# Altium footprint library SOM.PcbLib: 8 footprints
Each footprint in its own frame and in the unit in brackets; x right, y up, seen from the top. Pads: shape width x height; smd on the part's side, far side on the other; paste and mask are expansions set on the pad; w line width, h text height; cw(c..) or ccw(c..) is an arc to the next point about the centre after c.
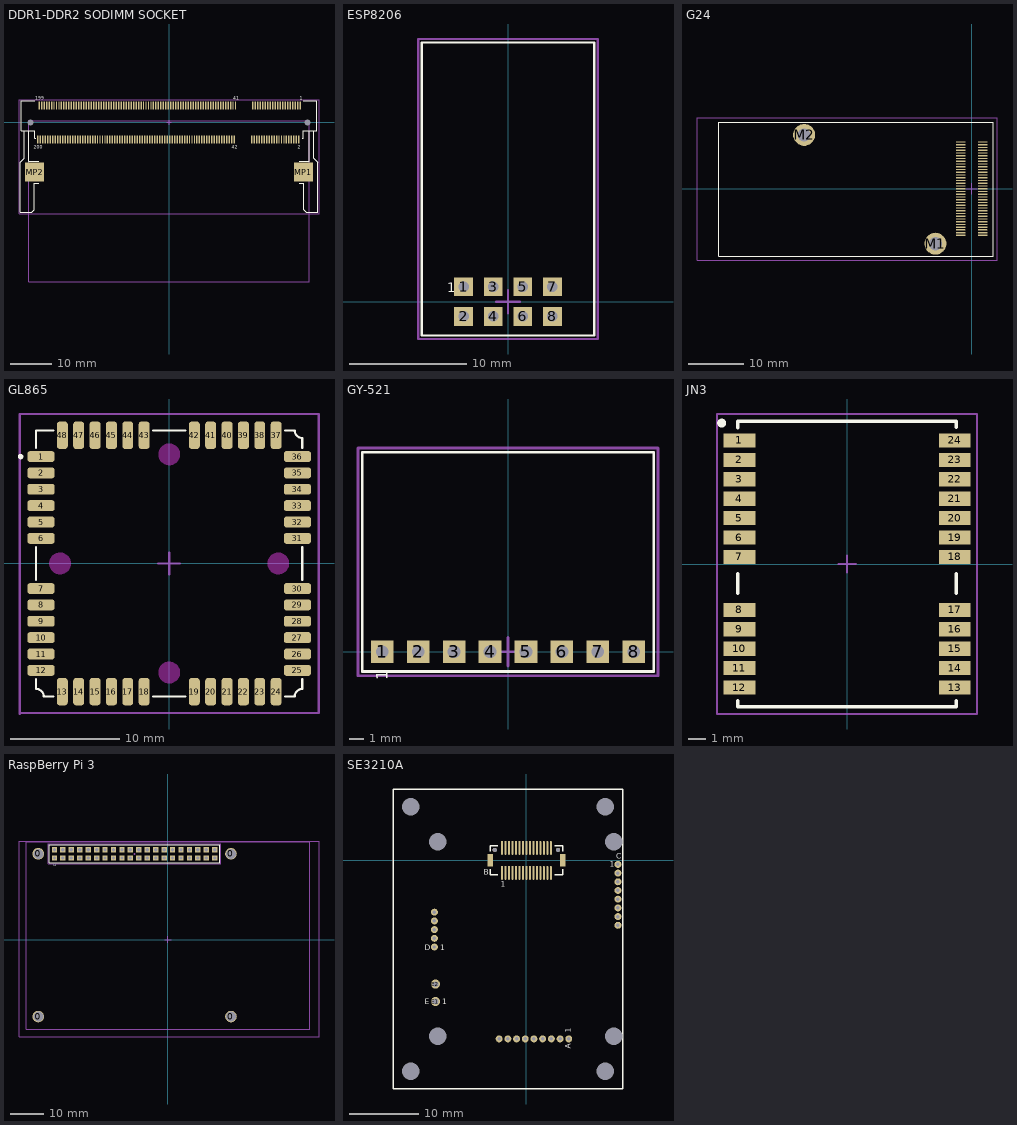
[diagram p0: the footprints below, top view; thin cyan lines are the x and y axes]

## DDR1-DDR2 SODIMM SOCKET [mm] "TE CONNECTIVITY - 1565917-4"
pads (204):
  round 0 hole 1.5 unplated: 0(-33.4,0.015) 0(33.4,0.015)
  rect 0.35x2 smd: 1(31.65,4.1) 2(31.35,-4.1) 3(31.05,4.1) 4(30.75,-4.1) 5(30.45,4.1) 6(30.15,-4.1) 7(29.85,4.1) 8(29.55,-4.1) 9(29.25,4.1) 10(28.95,-4.1) 11(28.65,4.1) 12(28.35,-4.1) 13(28.05,4.1) 14(27.75,-4.1) 15(27.45,4.1) 16(27.15,-4.1) 17(26.85,4.1) 18(26.55,-4.1) 19(26.25,4.1) 20(25.95,-4.1) 21(25.65,4.1) 22(25.35,-4.1) 23(25.05,4.1) 24(24.75,-4.1) 25(24.45,4.1) 26(24.15,-4.1) 27(23.85,4.1) 28(23.55,-4.1) 29(23.25,4.1) 30(22.95,-4.1) 31(22.65,4.1) 32(22.35,-4.1) 33(22.05,4.1) 34(21.75,-4.1) 35(21.45,4.1) 36(21.15,-4.1) 37(20.85,4.1) 38(20.55,-4.1) 39(20.25,4.1) 40(19.95,-4.1) 41(16.05,4.1) 42(15.75,-4.1) 43(15.45,4.1) 44(15.15,-4.1) 45(14.85,4.1) 46(14.55,-4.1) 47(14.25,4.1) 48(13.95,-4.1) 49(13.65,4.1) 50(13.35,-4.1) 51(13.05,4.1) 52(12.75,-4.1) 53(12.45,4.1) 54(12.15,-4.1) 55(11.85,4.1) 56(11.55,-4.1) 57(11.25,4.1) 58(10.95,-4.1) 59(10.65,4.1) 60(10.35,-4.1) 61(10.05,4.1) 62(9.75,-4.1) 63(9.45,4.1) 64(9.15,-4.1) 65(8.85,4.1) 66(8.55,-4.1) 67(8.25,4.1) 68(7.95,-4.1) 69(7.65,4.1) 70(7.35,-4.1) 71(7.05,4.1) 72(6.75,-4.1) 73(6.45,4.1) 74(6.15,-4.1) 75(5.85,4.1) 76(5.55,-4.1) 77(5.25,4.1) 78(4.95,-4.1) 79(4.65,4.1) 80(4.35,-4.1) 81(4.05,4.1) 82(3.75,-4.1) 83(3.45,4.1) 84(3.15,-4.1) 85(2.85,4.1) 86(2.55,-4.1) 87(2.25,4.1) 88(1.95,-4.1) 89(1.65,4.1) 90(1.35,-4.1) 91(1.05,4.1) 92(0.75,-4.1) 93(0.45,4.1) 94(0.15,-4.1) 95(-0.15,4.1) 96(-0.45,-4.1) 97(-0.75,4.1) 98(-1.05,-4.1) 99(-1.35,4.1) 100(-1.65,-4.1) 101(-1.95,4.1) 102(-2.25,-4.1) 103(-2.55,4.1) 104(-2.85,-4.1) 105(-3.15,4.1) 106(-3.45,-4.1) 107(-3.75,4.1) 108(-4.05,-4.1) 109(-4.35,4.1) 110(-4.65,-4.1) 111(-4.95,4.1) 112(-5.25,-4.1) 113(-5.55,4.1) 114(-5.85,-4.1) 115(-6.15,4.1) 116(-6.45,-4.1) 117(-6.75,4.1) 118(-7.05,-4.1) 119(-7.35,4.1) 120(-7.65,-4.1) 121(-7.95,4.1) 122(-8.25,-4.1) 123(-8.55,4.1) 124(-8.85,-4.1) 125(-9.15,4.1) 126(-9.45,-4.1) 127(-9.75,4.1) 128(-10.05,-4.1) 129(-10.35,4.1) 130(-10.65,-4.1) 131(-10.95,4.1) 132(-11.25,-4.1) 133(-11.55,4.1) 134(-11.85,-4.1) 135(-12.15,4.1) 136(-12.45,-4.1) 137(-12.75,4.1) 138(-13.05,-4.1) 139(-13.35,4.1) 140(-13.65,-4.1) 141(-13.95,4.1) 142(-14.25,-4.1) 143(-14.55,4.1) 144(-14.85,-4.1) 145(-15.15,4.1) 146(-15.45,-4.1) 147(-15.75,4.1) 148(-16.05,-4.1) 149(-16.35,4.1) 150(-16.65,-4.1) 151(-16.95,4.1) 152(-17.25,-4.1) 153(-17.55,4.1) 154(-17.85,-4.1) 155(-18.15,4.1) 156(-18.45,-4.1) 157(-18.75,4.1) 158(-19.05,-4.1) 159(-19.35,4.1) 160(-19.65,-4.1) 161(-19.95,4.1) 162(-20.25,-4.1) 163(-20.55,4.1) 164(-20.85,-4.1) 165(-21.15,4.1) 166(-21.45,-4.1) 167(-21.75,4.1) 168(-22.05,-4.1) 169(-22.35,4.1) 170(-22.65,-4.1) 171(-22.95,4.1) 172(-23.25,-4.1) 173(-23.55,4.1) 174(-23.85,-4.1) 175(-24.15,4.1) 176(-24.45,-4.1) 177(-24.75,4.1) 178(-25.05,-4.1) 179(-25.35,4.1) 180(-25.65,-4.1) 181(-25.95,4.1) 182(-26.25,-4.1) 183(-26.55,4.1) 184(-26.85,-4.1) 185(-27.15,4.1) 186(-27.45,-4.1) 187(-27.75,4.1) 188(-28.05,-4.1) 189(-28.35,4.1) 190(-28.65,-4.1) 191(-28.95,4.1) 192(-29.25,-4.1) 193(-29.55,4.1) 194(-29.85,-4.1) 195(-30.15,4.1) 196(-30.45,-4.1) 197(-30.75,4.1) 198(-31.05,-4.1) 199(-31.35,4.1) 200(-31.65,-4.1)
  rect 4.5x4.6 smd: MP1(32.45,-12) MP2(-32.45,-12)
Top Overlay:
  lines w0.2: -34.9,-1.95 -34.9,-8.6 -35.75,-9.45 -35.9,-9.6 -35.9,-21.7 -33.1,-21.7 -32.5,-21.1 -32.5,-14.7 -31.4,-14.7 ; -33.8,-1.95 -33.8,-9.3 -31.4,-9.3 ; -32.44,-1.96 -32.44,-3.8 -32.21,-3.8 ; -32.44,-1.95 -35.6,-1.95 -35.6,5.2 -32.35,5.2 ; 31.4,-14.7 32.5,-14.7 32.5,-21.1 33.1,-21.7 35.9,-21.7 35.9,-9.6 35.75,-9.45 34.9,-8.6 34.9,-1.95 ; 31.4,-9.3 33.8,-9.3 33.8,-1.95 ; 32.21,-3.8 32.44,-3.8 32.44,-1.96 ; 32.35,5.2 35.6,5.2 35.6,-1.95 32.44,-1.95
  text "1" at 31.5,5.5 h0.8
  text "41" at 15.5,5.5 h0.8
  text "199" at -32.3,5.5 h0.8
  text "200" at -32.7,-6.3 h0.8
  text "42" at 15.1,-6.3 h0.8
  text "2" at 31.1,-6.3 h0.8
Mechanical 8:
  lines w0.2: -34,0.4 -33.9,0.3 -33.9,-38.4 33.9,-38.4 33.9,0.4 -34,0.4
Mechanical 15:
  lines w0.1: -0.5,0 0.5,0 ; 0,-0.5 0,0.5 ; -36.2,-22 -36.2,5.5 36.2,5.5 36.2,-22 -36.2,-22
3D body "c-1565917-4-d1-3d.STEP": height 5.56, standoff -0.62, extent -35.75,-21.505 35.75,5.05
3D body "am33_rev1_3.STEP": height 5.76, standoff 1.3, extent -33.8,-38.257 33.8,0.3

## ESP8206 [mm] "WiFi Module"
pads (8):
  rect 1.6x1.6 hole 0.9 mask+0: 1(-3.81,1.27) 2(-3.81,-1.27) 3(-1.27,1.27) 4(-1.27,-1.27) 5(1.27,1.27) 6(1.27,-1.27) 7(3.81,1.27) 8(3.81,-1.27)
Top Overlay:
  lines w0.2: -7.4,-2.9 -7.2,-2.9 7.4,-2.9 7.4,22.2 -7.4,22.2 -7.4,-2.9
  text "1" at -5.2,0.8 h0.8
Mechanical 15:
  lines w0.2: -1,0 1,0 ; 0,-1 0,1 ; -7.7,-3.2 -7.7,22.5 7.7,22.5 7.7,-3.2 -7.7,-3.2
3D body "User Library-Wi07C.step": height 5.88, standoff -5.8, extent -7.26,-2.78 7.24,22.02

## G24 [mm]
pads (72):
  oval 1.8x0.25 smd: 1(2,-8.5) 2(-2,-8.5) 3(2,-8) 4(-2,-8) 5(2,-7.5) 6(-2,-7.5) 7(2,-7) 8(-2,-7) 9(2,-6.5) 10(-2,-6.5) 11(2,-6) 12(-2,-6) 13(2,-5.5) 14(-2,-5.5) 15(2,-5) 16(-2,-5) 17(2,-4.5) 18(-2,-4.5) 19(2,-4) 20(-2,-4) 21(2,-3.5) 22(-2,-3.5) 23(2,-3) 24(-2,-3) 25(2,-2.5) 26(-2,-2.5) 27(2,-2) 28(-2,-2) 29(2,-1.5) 30(-2,-1.5) 31(2,-1) 32(-2,-1) 33(2,-0.5) 34(-2,-0.5) 35(2,0) 36(-2,0) 37(2,0.5) 38(-2,0.5) 39(2,1) 40(-2,1) 41(2,1.5) 42(-2,1.5) 43(2,2) 44(-2,2) 45(2,2.5) 46(-2,2.5) 47(2,3) 48(-2,3) 49(2,3.5) 50(-2,3.5) 51(2,4) 52(-2,4) 53(2,4.5) 54(-2,4.5) 55(2,5) 56(-2,5) 57(2,5.5) 58(-2,5.5) 59(2,6) 60(-2,6) 61(2,6.5) 62(-2,6.5) 63(2,7) 64(-2,7) 65(2,7.5) 66(-2,7.5) 67(2,8) 68(-2,8) 69(2,8.5) 70(-2,8.5)
  round 4 hole 2.4: M1(-6.6,-10) M2(-30.5,9.8)
Top Overlay:
  lines w0.2: -46,-12.3 -46,12.1 3.9,12.1 3.9,-12.3 -46,-12.3
Mechanical 15:
  lines w0.2: -1,0 1,0 ; 0,-1 0,1 ; -50,-13 -50,12.9 4.6,12.9 4.6,-13 -50,-13
3D body "G24.STEP": height 5.8, standoff -0.1, extent -45.795,-12.3 3.95,12.1
3D body "529910708.STEP": height 2.29, standoff 0, extent -2.7,-10.65 2.7,10.65

## GL865 [mm]
pads (48):
  rrect50% 2.5x1 smd: 1(-11.75,9.8) 2(-11.75,8.3) 3(-11.75,6.8) 4(-11.75,5.3) 5(-11.75,3.8) 6(-11.75,2.3) 7(-11.75,-2.3) 8(-11.75,-3.8) 9(-11.75,-5.3) 10(-11.75,-6.8) 11(-11.75,-8.3) 12(-11.75,-9.8) 25(11.75,-9.8) 26(11.75,-8.3) 27(11.75,-6.8) 28(11.75,-5.3) 29(11.75,-3.8) 30(11.75,-2.3) 31(11.75,2.3) 32(11.75,3.8) 33(11.75,5.3) 34(11.75,6.8) 35(11.75,8.3) 36(11.75,9.8)
  rrect50% 1x2.5 smd: 13(-9.8,-11.75) 14(-8.3,-11.75) 15(-6.8,-11.75) 16(-5.3,-11.75) 17(-3.8,-11.75) 18(-2.3,-11.75) 19(2.3,-11.75) 20(3.8,-11.75) 21(5.3,-11.75) 22(6.8,-11.75) 23(8.3,-11.75) 24(9.8,-11.75) 37(9.8,11.75) 38(8.3,11.75) 39(6.8,11.75) 40(5.3,11.75) 41(3.8,11.75) 42(2.3,11.75) 43(-2.3,11.75) 44(-3.8,11.75) 45(-5.3,11.75) 46(-6.8,11.75) 47(-8.3,11.75) 48(-9.8,11.75)
Top Layer keep-out:
  circle w1: c10,0 r0.5
  circle w1: c0,-10 r0.5
  circle w1: c-10,0 r0.5
  circle w1: c0,10 r0.5
Top Overlay:
  circle w0.25: c-13.625,9.8 r0.125
  lines w0.2: -12.2,-10.6 -12.2,-11.5 cw(c-12.2,-12.2) -11.5,-12.2 -10.6,-12.2 ; -12.2,-1.5 -12.2,1.5 ; -12.2,10.6 -12.2,12.2 -10.6,12.2 ; -1.5,-12.2 1.5,-12.2 ; -1.5,12.2 1.5,12.2 ; 10.6,-12.2 11.5,-12.2 cw(c12.2,-12.2) 12.2,-11.5 12.2,-10.6 ; 10.6,12.2 11.5,12.2 ccw(c12.2,12.2) 12.2,11.5 12.2,10.6 ; 12.2,-1.5 12.2,1.5
Mechanical 15:
  lines w0.2: -13.7,-13.8 -13.7,13.7 13.71,13.7 13.71,-13.71 -13.7,-13.71 ; -1,0 1,0 ; 0,-1 0,1
3D body "Telit GL865.STEP": height 2.7, standoff -0.01, extent -12.21,-12.21 12.21,12.21

## GY-521 [mm] "GYRO/ACCEL Module"
pads (8):
  rect 1.6x1.6 hole 0.9 mask+0: 1(-8.89,0) 2(-6.35,0) 3(-3.81,0) 4(-1.27,0) 5(1.27,0) 6(3.81,0) 7(6.35,0) 8(8.89,0)
Top Overlay:
  lines w0.2: -10.3,-1.4 -9.51,-1.4 10.3,-1.4 10.3,14.1 -10.3,14.1 -10.3,-1.4
  text "1" at -8.5,-2 h0.8
Mechanical 15:
  lines w0.2: -1,0 1,0 ; 0,-1 0,1 ; -10.6,-1.7 -10.6,14.4 10.6,14.4 10.6,-1.7 -10.6,-1.7
3D body "GY-521.STEP": height 5.67, standoff -6.15, extent -10.145,-1.25 10.175,13.995

## JN3 [mm]
height 2.4
pads (24):
  rect 1.8x0.8 smd: 1(-6.1,7) 2(-6.1,5.9) 3(-6.1,4.8) 4(-6.1,3.7) 5(-6.1,2.6) 6(-6.1,1.5) 7(-6.1,0.4) 8(-6.1,-2.6) 9(-6.1,-3.7) 10(-6.1,-4.8) 11(-6.1,-5.9) 12(-6.1,-7) 13(6.1,-7) 14(6.1,-5.9) 15(6.1,-4.8) 16(6.1,-3.7) 17(6.1,-2.6) 18(6.1,0.4) 19(6.1,1.5) 20(6.1,2.6) 21(6.1,3.7) 22(6.1,4.8) 23(6.1,5.9) 24(6.1,7)
Top Overlay:
  circle w0.25: c-7.108,7.986 r0.125
  lines w0.2: -6.2,-7.762 -6.2,-8.1 6.2,-8.1 6.2,-7.762 ; -6.192,-1.666 -6.192,-0.566 ; -6.19,7.71 -6.19,8.1 6.2,8.1 6.2,7.746 ; 6.2,-1.666 6.2,-0.566
Mechanical 15:
  lines w0.1: -0.5,0 0.5,0 ; 0,-0.5 0,0.5 ; -7.37,-8.5 7.362,-8.5 7.362,8.5 -7.37,8.5 -7.37,-8.5
3D body "Telit JN3 GPS.STEP": height 2.4, standoff 0, extent -6.1,-8 6.1,8

## RaspBerry Pi 3 [mm] "Connector for RaspBerry Pi 3"
pads (44):
  round 3.5 hole 3 unplated: 0(-39,-23.175) 0(-39,25.825) 0(19,-23.175) 0(19,25.825)
  rect 1.6x1.6 hole 1: 1(-34.13,24.53) 2(-34.13,27.07) 3(-31.59,24.53) 4(-31.59,27.07) 5(-29.05,24.53) 6(-29.05,27.07) 7(-26.51,24.53) 8(-26.51,27.07) 9(-23.97,24.53) 10(-23.97,27.07) 11(-21.43,24.53) 12(-21.43,27.07) 13(-18.89,24.53) 14(-18.89,27.07) 15(-16.35,24.53) 16(-16.35,27.07) 17(-13.81,24.53) 18(-13.81,27.07) 19(-11.27,24.53) 20(-11.27,27.07) 21(-8.73,24.53) 22(-8.73,27.07) 23(-6.19,24.53) 24(-6.19,27.07) 25(-3.65,24.53) 26(-3.65,27.07) 27(-1.11,24.53) 28(-1.11,27.07) 29(1.43,24.53) 30(1.43,27.07) 31(3.97,24.53) 32(3.97,27.07) 33(6.51,24.53) 34(6.51,27.07) 35(9.05,24.53) 36(9.05,27.07) 37(11.59,24.53) 38(11.59,27.07) 39(14.13,24.53) 40(14.13,27.07)
Top Overlay:
  lines w0.254: -35.7,23.1 15.7,23.1 15.7,28.5 -35.7,28.5 -35.7,23.1
  text "1" at -33.8,22.6 h0.76
Mechanical 8:
  lines w0.2: -42.675,-26.95 -42.675,29.45 42.775,29.45 42.775,-26.95 -42.675,-26.95
Mechanical 15:
  lines w0.1: -10.25,25.8 -9.75,25.8 ; -10,25.55 -10,26.05 ; -36,22.8 -36,28.8 16,28.8 16,22.8 -36,22.8
  lines w0.2: -1,0 1,0 ; 0,-1 0,1 ; -44.8,-29.3 -44.8,29.65 45.5,29.65 45.5,-29.3 -44.8,-29.3
3D body "User Library-PBD2_54-40.STEP": height 1.1, standoff -10, extent -35.325,23.22 15.475,28.3
3D body "User Library-RaspberryPi2 STEP214.STEP": height 3, standoff -15.75, extent -44.5,-29 45.12,29.3

## SE3210A [mm]
pads (66):
  round 0 hole 2.5 unplated: 0(-16.65,-30.3) 0(-16.65,7.7) 0(-12.77,-25.3) 0(-12.77,2.7) 0(11.35,-30.3) 0(11.35,7.7) 0(12.53,-25.3) 0(12.53,2.7)
  rect 0.8x1.8 smd: 0(-5.2,0) 0(5.2,0)
  round 0.6 hole 0.6 unplated: 0(-4.55,1.5) 0(4.55,1.5)
  round 1 hole 0.5: A1(6.08,-25.65) A2(4.83,-25.65) A3(3.58,-25.65) A4(2.33,-25.65) A5(1.08,-25.65) A6(-0.17,-25.65) A7(-1.42,-25.65) A8(-2.67,-25.65) A9(-3.92,-25.65) C1(13.15,-0.58) C2(13.15,-1.83) C3(13.15,-3.08) C4(13.15,-4.33) C5(13.15,-5.58) C6(13.15,-6.83) C7(13.15,-8.08) C8(13.15,-9.33) D1(-13.22,-12.45) D2(-13.22,-11.2) D3(-13.22,-9.95) D4(-13.22,-8.7) D5(-13.22,-7.45)
  oval 0.3x2 smd: B1(-3.5,-1.8) B2(-3.5,1.8) B3(-3,-1.8) B4(-3,1.8) B5(-2.5,-1.8) B6(-2.5,1.8) B7(-2,-1.8) B8(-2,1.8) B9(-1.5,-1.8) B10(-1.5,1.8) B11(-1,-1.8) B12(-1,1.8) B13(-0.5,-1.8) B14(-0.5,1.8) B15(0,-1.8) B16(0,1.8) B17(0.5,-1.8) B18(0.5,1.8) B19(1,-1.8) B20(1,1.8) B21(1.5,-1.8) B22(1.5,1.8) B23(2,-1.8) B24(2,1.8) B25(2.5,-1.8) B26(2.5,1.8) B27(3,-1.8) B28(3,1.8) B29(3.5,-1.8) B30(3.5,1.8)
  round 1.3 hole 0.8: E1(-13.07,-20.28) E2(-13.07,-17.78)
Top Overlay:
  lines w0.2: -5.2,-1.3 -5.2,-2.1 -4.1,-2.1 ; -5.2,1.3 -5.2,2.1 -4.1,2.1 ; 4.1,-2.1 5.2,-2.1 5.2,-1.3 ; 4.1,2.1 5.2,2.1 5.2,1.3 ; -19.15,-32.85 -19.15,10.25 13.85,10.25 13.85,-32.85 -19.15,-32.85
  text "E" at -14.6,-20.7 h0.8
  text "D" at -14.6,-12.9 h0.8
  text "C" at 12.9,0.2 h0.8
  text "B" at -6.1,-2.1 h0.8
  text "A" at 6.4,-27.1 h0.8
  text "1" at -3.7,-3.8 h0.8
  text "1" at -12.4,-12.9 h0.8
  text "1" at -12.1,-20.7 h0.8
  text "1" at 6.4,-24.8 h0.8
  text "1" at 12,-0.9 h0.8
3D body "C119006-301-03 RevD.STEP": height 9.23, standoff 0.75, extent -19.15,-32.85 13.85,10.25
3D body "DF12-30DS-0.5V.STEP": height 2.7, standoff -0.6, extent -5.3,-2.3 5.3,2.3